# Altium footprint library EwgConnectors.PcbLib: 125 footprints (part 8 of 8)
Each footprint in its own frame and in the unit in brackets; x right, y up, seen from the top. Pads: shape width x height; smd on the part's side, far side on the other; paste and mask are expansions set on the pad; w line width, h text height; cw(c..) or ccw(c..) is an arc to the next point about the centre after c.
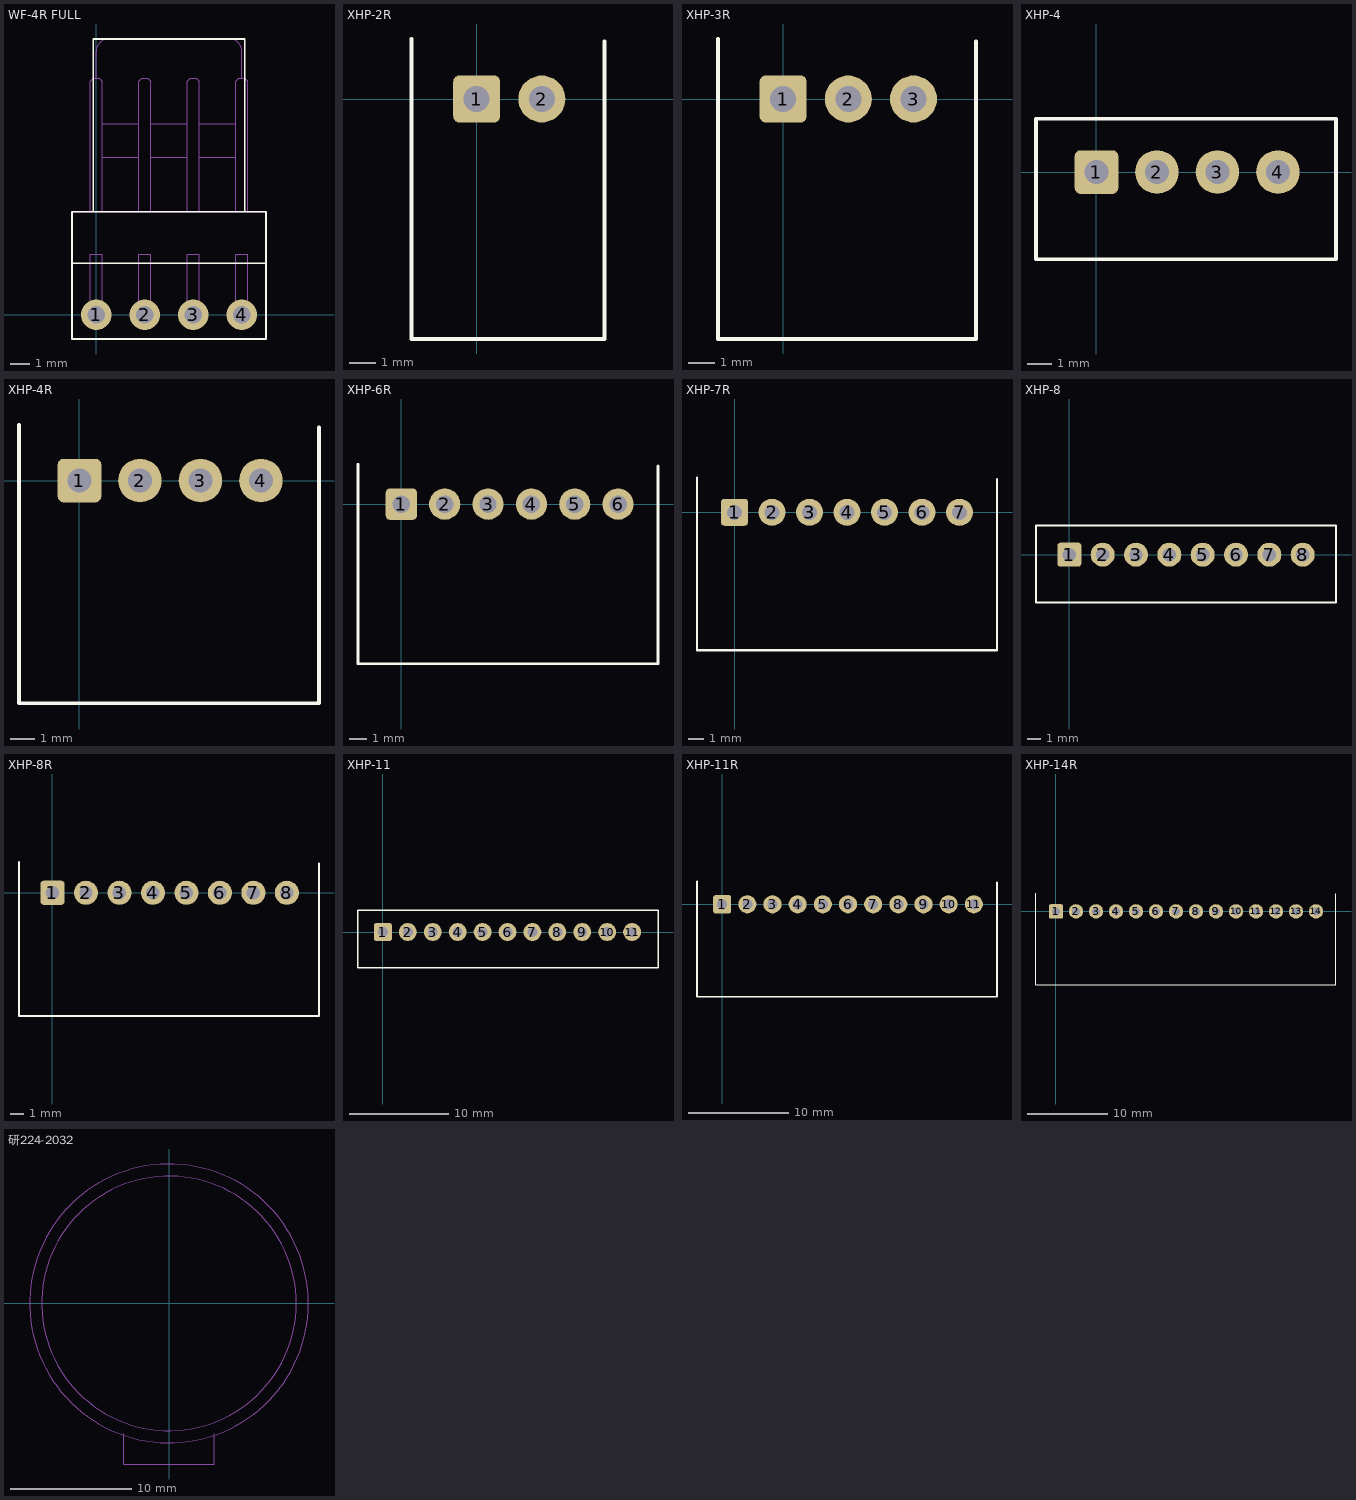
[diagram p7: the footprints below, top view; thin cyan lines are the x and y axes]

## WF-4R FULL [mm]
pads (4):
  round 1.6 hole 0.9: 1(0,0) 2(2.54,0) 3(5.08,0) 4(7.62,0)
Top Overlay:
  lines w0.1: -0.159,5.397 -0.159,14.446 7.779,14.446 7.779,5.397 ; -1.27,2.699 8.89,2.699 ; -1.27,2.699 -1.27,-1.27 8.89,-1.27 8.89,2.699 ; -1.27,2.699 -1.27,5.397 8.89,5.397 8.89,2.699
Mechanical 1:
  lines w0.05: -0.318,5.397 -0.318,12.224 -0.159,12.383 0.159,12.383 0.318,12.224 0.318,5.397 ; 0,12.383 0,13.811 cw(c0.635,13.811) 0.635,14.446 6.985,14.446 cw(c6.985,13.811) 7.62,13.811 7.62,12.383 ; 0.318,8.255 2.222,8.255 ; 0.318,10.001 2.222,10.001 ; 2.222,5.397 2.222,12.224 2.381,12.383 2.699,12.383 2.857,12.224 2.857,5.397 ; 2.857,8.255 4.763,8.255 ; 2.857,10.001 4.763,10.001 ; 4.763,5.397 4.763,12.224 4.921,12.383 5.239,12.383 5.397,12.224 5.397,5.397 ; 5.397,8.255 7.302,8.255 ; 5.397,10.001 7.302,10.001 ; 7.302,5.397 7.302,12.224 7.461,12.383 7.779,12.383 7.938,12.224 7.938,5.397 ; -0.318,2.699 -0.318,0 ccw(c0,0) 0.318,0 0.318,2.699 ; -0.318,2.699 -1.27,2.699 -1.27,5.397 8.89,5.397 8.89,2.699 7.938,2.699 ; -0.318,2.699 -0.318,3.175 0.318,3.175 0.318,2.699 ; 0.318,2.699 2.222,2.699 ; 2.222,2.699 2.222,0 ccw(c2.54,0) 2.857,0 2.857,2.699 ; 2.222,2.699 2.222,2.857 2.222,3.175 2.857,3.175 2.857,2.699 ; 2.857,2.699 4.763,2.699 ; 4.763,2.699 4.763,0 ccw(c5.08,0) 5.397,0 5.397,2.699 ; 4.763,2.699 4.763,2.857 4.763,3.175 5.397,3.175 5.397,2.699 ; 5.397,2.699 7.302,2.699 ; 7.302,2.699 7.302,0 ccw(c7.62,0) 7.938,0 7.938,2.699 ; 7.302,2.699 7.302,2.857 7.302,3.175 7.938,3.175 7.938,2.699
3D body: height 5.8, standoff -3.5, extent -1.3,-0.3 8.9,14.425
3D body: height 5.9, standoff 0.6, extent -1.54,5.397 9.16,20.097

## XHP-2R [mm]
pads (2):
  rrect25% 1.8x1.8 hole 1: 1(0,0)
  round 1.8 hole 1: 2(2.5,0)
Top Overlay:
  lines w0.15: -2.5,2.3 -2.5,-9.2 4.9,-9.2 4.9,2.2
3D body: height 6.1, standoff -2, extent -2.5,-9.25 4.9,2.25

## XHP-3R [mm]
pads (3):
  rrect25% 1.8x1.8 hole 1: 1(0,0)
  round 1.8 hole 1: 2(2.5,0) 3(5,0)
Top Overlay:
  lines w0.15: -2.5,2.3 -2.5,-9.2 7.4,-9.2 7.4,2.2
3D body: height 6.1, standoff -2, extent -2.5,-9.25 7.4,2.25

## XHP-4 [mm]
pads (4):
  rrect25% 1.8x1.8 hole 1: 1(0,0)
  round 1.8 hole 1: 2(2.5,0) 3(5,0) 4(7.5,0)
Top Overlay:
  lines w0.15: -2.5,-3.6 -2.5,2.2 9.9,2.2 9.9,-3.6 -2.5,-3.6
3D body: height 7, standoff -3.5, extent -2.5,-3.55 10,2.2

## XHP-4R [mm]
pads (4):
  rrect25% 1.8x1.8 hole 1: 1(0,0)
  round 1.8 hole 1: 2(2.5,0) 3(5,0) 4(7.5,0)
Top Overlay:
  lines w0.15: -2.5,2.3 -2.5,-9.2 9.9,-9.2 9.9,2.2
3D body: height 6.1, standoff -2, extent 0.5,-9.25 9.9,2.25
3D body: height 6.1, standoff -2, extent -2.4,-9.25 7,2.25

## XHP-6R [mm]
pads (6):
  rrect25% 1.8x1.8 hole 1: 1(0,0)
  round 1.8 hole 1: 2(2.5,0) 3(5,0) 4(7.5,0) 5(10,0) 6(12.5,0)
Top Overlay:
  lines w0.15: -2.5,2.3 -2.5,-9.2 14.8,-9.2 14.8,2.2
3D body: height 6.1, standoff -2, extent 5.5,-9.25 14.9,2.25
3D body: height 6.1, standoff -2, extent 6.2,-9.25 11.409,0.25
3D body: height 6.1, standoff -2, extent -2.4,-9.25 7,2.25

## XHP-7R [mm]
pads (7):
  rrect25% 1.8x1.8 hole 1: 1(0,0)
  round 1.8 hole 1: 2(2.5,0) 3(5,0) 4(7.5,0) 5(10,0) 6(12.5,0) 7(15,0)
Top Overlay:
  lines w0.15: -2.5,2.3 -2.5,-9.2 17.5,-9.2 17.5,2.2
3D body: height 6.1, standoff -2, extent -2.5,-9.25 17.4,2.25

## XHP-8 [mm]
pads (8):
  rrect25% 1.8x1.8 hole 1: 1(0,0)
  round 1.8 hole 1: 2(2.5,0) 3(5,0) 4(7.5,0) 5(10,0) 6(12.5,0) 7(15,0) 8(17.5,0)
Top Overlay:
  lines w0.15: -2.5,-3.6 -2.5,2.2 20,2.2 20,-3.6 -2.5,-3.6
3D body: height 7, standoff -3.5, extent -2.5,-3.55 20,2.2

## XHP-8R [mm]
pads (8):
  rrect25% 1.8x1.8 hole 1: 1(0,0)
  round 1.8 hole 1: 2(2.5,0) 3(5,0) 4(7.5,0) 5(10,0) 6(12.5,0) 7(15,0) 8(17.5,0)
Top Overlay:
  lines w0.15: -2.5,2.3 -2.5,-9.2 19.9,-9.2 19.9,2.2
3D body: height 6.1, standoff -2, extent -2.5,-9.25 19.9,2.25

## XHP-11 [mm]
pads (11):
  rrect25% 1.8x1.8 hole 1: 1(0,0)
  round 1.8 hole 1: 2(2.5,0) 3(5,0) 4(7.5,0) 5(10,0) 6(12.5,0) 7(15,0) 8(17.5,0) 9(20,0) 10(22.5,0) 11(25,0)
Top Overlay:
  lines w0.15: -2.5,-3.6 27.6,-3.6 27.6,2.2 -2.5,2.2 -2.5,-3.6
3D body: height 7, standoff -3.5, extent 15.908,-3.55 21.092,2.2
3D body: height 7, standoff -3.5, extent 21.05,-3.55 27.55,2.2
3D body: height 7, standoff -3.5, extent 13.408,-3.55 18.592,2.2
3D body: height 7, standoff -3.5, extent 8.408,-3.55 13.592,2.2
3D body: height 7, standoff -3.5, extent 3.408,-3.55 8.592,2.2
3D body: height 7, standoff -3.5, extent -2.5,-3.55 4,2.2

## XHP-11R [mm]
pads (11):
  rrect25% 1.8x1.8 hole 1: 1(0,0)
  round 1.8 hole 1: 2(2.5,0) 3(5,0) 4(7.5,0) 5(10,0) 6(12.5,0) 7(15,0) 8(17.5,0) 9(20,0) 10(22.5,0) 11(25,0)
Top Overlay:
  lines w0.15: -2.5,2.3 -2.5,-9.2 27.3,-9.2 27.3,2.2
3D body: height 6.1, standoff -2, extent 18,-9.25 27.4,2.25
3D body: height 6.1, standoff -2, extent 16.2,-9.25 21.409,0.25
3D body: height 6.1, standoff -2, extent 11.2,-9.25 16.409,0.25
3D body: height 6.1, standoff -2, extent 6.2,-9.25 11.409,0.25
3D body: height 6.1, standoff -2, extent -2.4,-9.25 7,2.25

## XHP-14R [mm]
pads (14):
  rrect25% 1.8x1.8 hole 1: 1(0,0)
  round 1.8 hole 1: 2(2.5,0) 3(5,0) 4(7.5,0) 5(10,0) 6(12.5,0) 7(15,0) 8(17.5,0) 9(20,0) 10(22.5,0) 11(25,0) 12(27.5,0) 13(30,0) 14(32.5,0)
Top Overlay:
  lines w0.15: -2.5,2.3 -2.5,-9.2 35,-9.2 35,2.2
3D body: height 6.1, standoff -2, extent -2.4,-9.25 7,2.25
3D body: height 6.1, standoff -2, extent 6.2,-9.25 11.409,0.25
3D body: height 6.1, standoff -2, extent 11.2,-9.25 16.409,0.25
3D body: height 6.1, standoff -2, extent 21.2,-9.25 26.409,0.25
3D body: height 6.1, standoff -2, extent 16.2,-9.25 21.409,0.25
3D body: height 6.1, standoff -2, extent 25.5,-9.25 34.9,2.25

## 研224-2032 [mm]
Mechanical 1:
  circle w0.1: c0,0 r10.5
  circle w0.1: c0,0 r11.5
  lines w0.1: -3.75,-10.75 -3.75,-13.25 3.75,-13.25 ; 0,-13.25 3.75,-13.25 ; 3.75,-10.75 3.75,-13.25